# Altium footprint library 10A_Motor_Driver.PcbLib: 68 footprints (part 3 of 5)
Each footprint in its own frame and in the unit in brackets; x right, y up, seen from the top. Pads: shape width x height; smd on the part's side, far side on the other; paste and mask are expansions set on the pad; w line width, h text height; cw(c..) or ccw(c..) is an arc to the next point about the centre after c.
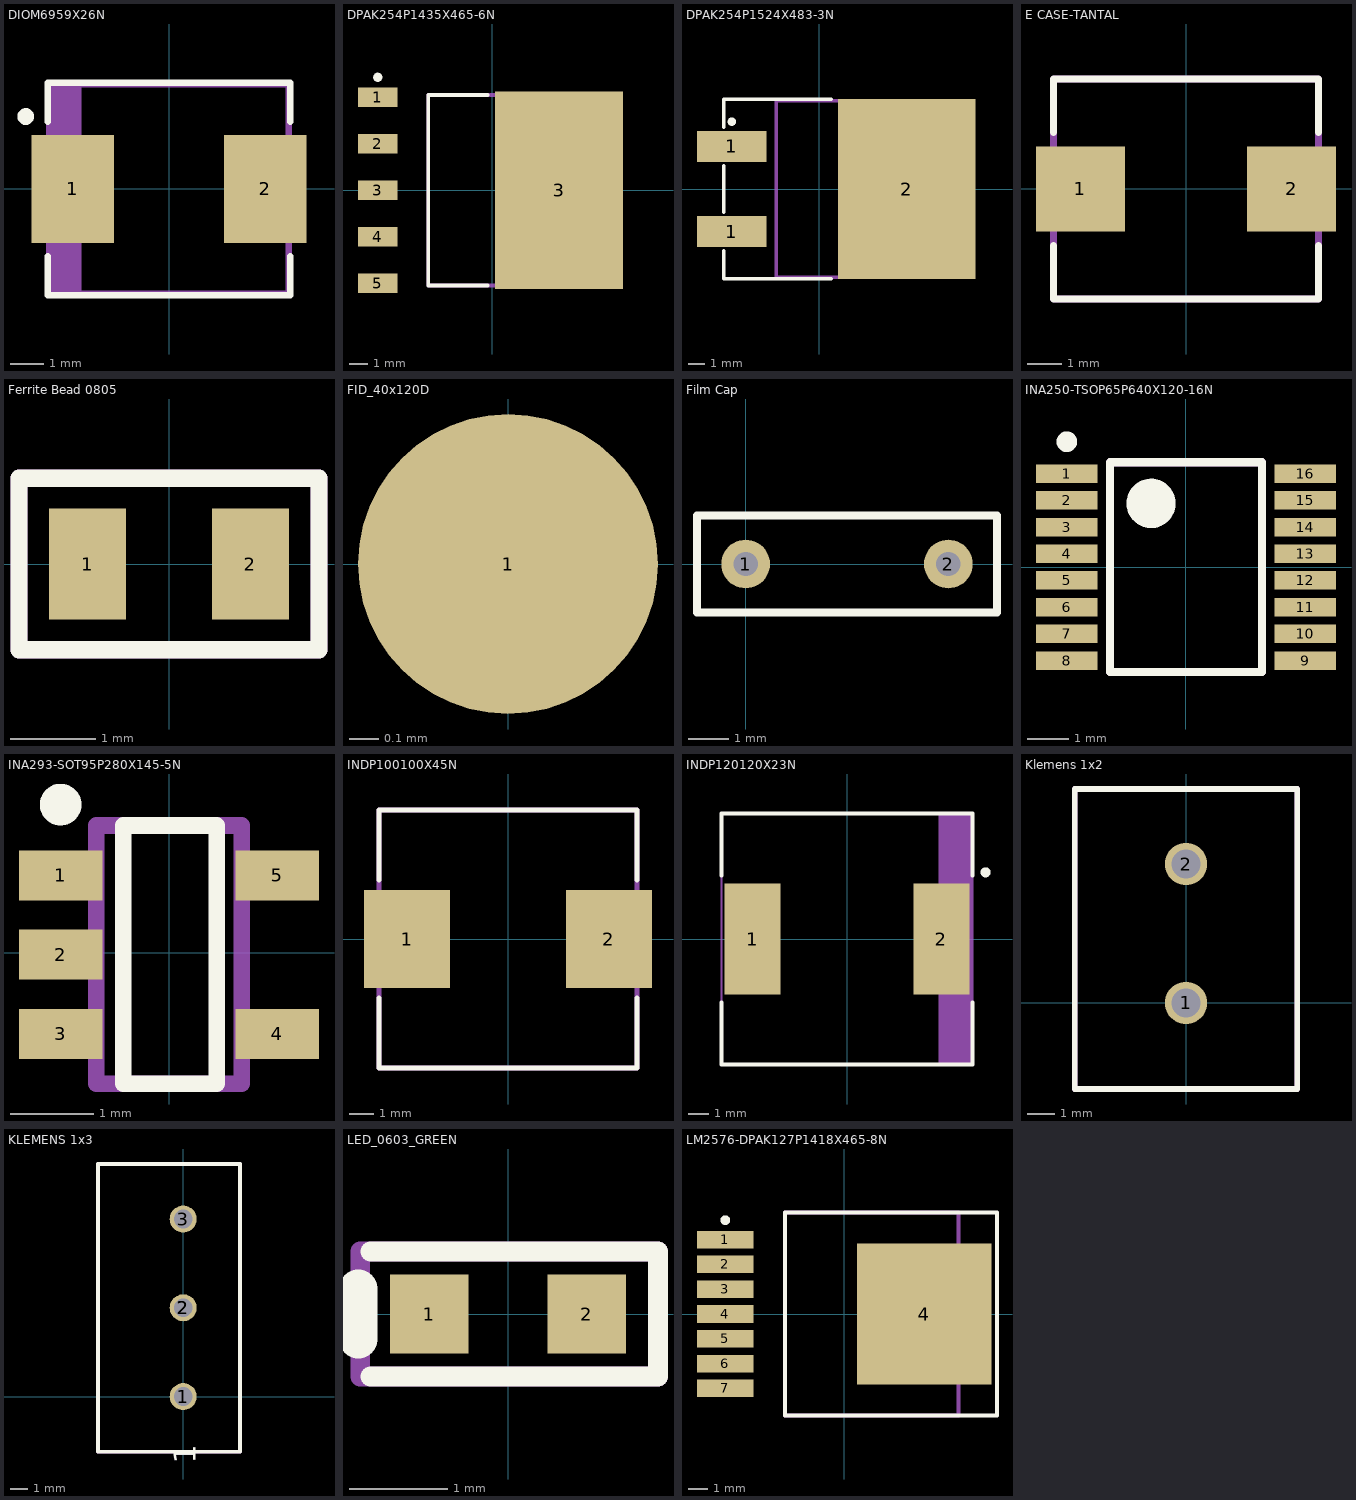
[diagram p2: the footprints below, top view; thin cyan lines are the x and y axes]

## DIOM6959X26N [mm] "Molded Diode, 2-Leads, Body 6,86x5,91mm, IPC Medium Density"
height 2.62
pads (2):
  rect 2.45x3.2 smd: 1(-2.85,0) 2(2.85,0)
Top Overlay:
  circle w0.25: c-4.25,2.15 r0.125
  lines w0.2: -3.6,-2 -3.6,-3.15 3.6,-3.15 3.6,-2 ; -3.6,2 -3.6,3.15 3.6,3.15 3.6,2
Top Assembly (Mech29):
  rectangle: -3.555,-3.11 -2.599,3.11
  lines w0.2: -3.555,-3.11 3.555,-3.11 3.555,3.11 -3.555,3.11 -3.555,-3.11
3D body "DIOM6959X26N.step": height 2.62, standoff 0, extent -3.775,-3.11 3.775,3.11

## DPAK254P1435X465-6N [mm] "D2-PAK, 6-Pads, Body 7,55x8,57mm (max), IPC Medium Density"
height 4.65
pads (6):
  rect 2.16x1.07 smd: 1(-6.25,5.08) 2(-6.25,2.54) 3(-6.25,0) 4(-6.25,-2.54) 5(-6.25,-5.08)
  rect 6.99x10.8 smd: 3(3.65,0)
Top Overlay:
  circle w0.25: c-6.25,6.165 r0.125
  lines w0.2: -0.245,-5.2 -3.5,-5.2 -3.5,5.2 -0.245,5.2
Top Assembly (Mech29):
  lines w0.2: -3.5,-5.2 5.39,-5.2 5.39,5.2 -3.5,5.2 -3.5,-5.2
3D body "DPAK254P1435X465-6N.step": height 4.8, standoff 0, extent -7.255,-5.5 7.095,5.5

## DPAK254P1524X483-3N [mm] "D2-PAK, 3-Pads, Body 7,93x8,70mm (max), IPC Medium Density"
height 4.83
pads (3):
  rect 4.15x1.85 smd: 1(-5.225,-2.54) 1(-5.225,2.54)
  rect 8.2x10.75 smd: 2(5.225,0)
Top Overlay:
  circle w0.25: c-5.225,4.015 r0.125
  lines w0.2: -5.706,-5.35 0.725,-5.35 ; -5.706,-5.334 -5.706,-3.683 ; -5.706,-1.397 -5.706,1.397 ; -5.706,3.683 -5.706,5.334 ; -5.706,5.35 0.725,5.35
Top Assembly (Mech29):
  lines w0.2: 7,-5.275 -2.575,-5.275 -2.575,5.275 7.025,5.275 7.025,-5.275
3D body "DPAK254P1524X483-3N.step": height 4.93, standoff 0, extent -5.545,-5.325 9.7,5.325

## E CASE-TANTAL [mm] "Molded Capacitor, 2-Leads, Body 7,30x6,00mm, IPC Medium Density"
height 4.6
pads (2):
  rect 2.55x2.45 smd: 1(-3.025,0) 2(3.025,0)
Top Overlay:
  lines w0.2: -3.8,-1.625 -3.8,-3.15 3.8,-3.15 3.8,-1.625 ; -3.8,1.625 -3.8,3.15 3.8,3.15 3.8,1.625
Top Assembly (Mech29):
  lines w0.2: -3.8,-3.15 -3.8,3.15 3.8,3.15 3.8,-3.15 -3.8,-3.15
3D body "E CASE-TANTAL.step": height 4.6, standoff 0, extent -4.02,-3.15 4.02,3.15

## Ferrite Bead 0805 [mm]
pads (2):
  rect 0.9x1.3 smd: 1(-0.95,0) 2(0.95,0)
Top Overlay:
  lines w0.2: -1.75,-1 1.75,-1 1.75,1 -1.75,1 -1.75,-1
Assembly Notes:
  lines w0.2: -1.75,-1 -1.75,1 1.75,1 1.75,-1 -1.75,-1
Top Assembly (Mech29):
  lines w0.2: -1.75,-1 -1.75,1 1.75,1 1.75,-1 -1.75,-1
  text ".Designator" at -1.3,-0.7 h0.6
3D body "User Library-ind_0805.step": height 0.95, standoff 0, extent -1,-0.6 1,0.6

## FID_40x120D [mil]
pads (1):
  round 40 smd paste-1574.8 mask+40: 1(0,0)

## Film Cap [mm]
pads (2):
  round 1.2 hole 0.6: 1(0,0) 2(5,0)
Top Overlay:
  lines w0.2: -1.2,-1.2 6.2,-1.2 6.2,1.2 -1.2,1.2 -1.2,-1.2
3D body "User Library-Cap-5 (7_2x6_5x2_2)Dark.step": height 8.53, standoff -2, extent -1.101,-1.1 6.103,1.1

## Heat Sink TO-220 [mm]
3D body "User Library-DISS_ML33.STEP": height 36.4, standoff -0.04, extent -17.548,3.411 20.298,23.401

## INA250-TSOP65P640X120-16N [mm] "TSOP, 16-Leads, Body 5,00x4,40mm, Pitch 0,65mm, IPC Medium Density"
height 1.2
pads (16):
  rect 1.5x0.45 smd mask+0.06: 1(-2.9,2.275) 2(-2.9,1.625) 3(-2.9,0.975) 4(-2.9,0.325) 5(-2.9,-0.325) 6(-2.9,-0.975) 7(-2.9,-1.625) 8(-2.9,-2.275) 9(2.9,-2.275) 10(2.9,-1.625) 11(2.9,-0.975) 12(2.9,-0.325) 13(2.9,0.325) 14(2.9,0.975) 15(2.9,1.625) 16(2.9,2.275)
Top Overlay:
  circle w0.6: c-0.85,1.55 r0.3
  circle w0.25: c-2.9,3.05 r0.125
  lines w0.2: -1.85,-2.55 1.85,-2.55 1.85,2.55 -1.85,2.55 -1.85,-2.55
Top Assembly (Mech29):
  circle w0.254: c-0.825,1.575 r0.25
  lines w0.2: -1.85,-2.55 1.85,-2.55 1.85,2.55 -1.85,2.55 -1.85,-2.55
  text ".Designator" at 0.833,-1.2 h0.8
3D body "TSOP65P640X120-16N.step": height 1.2, standoff 0, extent -3.2,-2.55 3.2,2.55

## INA293-SOT95P280X145-5N [mm] "SOT23, 5-Leads, Body 2,90x2,80mm, Pitch 0,95mm, IPC Medium Density"
height 1.45
pads (5):
  rect 1x0.6 smd: 1(-1.3,0.925) 2(-1.3,-0.025) 3(-1.3,-0.975) 4(1.3,-0.975) 5(1.3,0.925)
Top Overlay:
  circle w0.25: c-1.3,1.775 r0.125
  lines w0.2: -0.55,-1.575 -0.55,1.525 0.575,1.525 0.575,-1.575 -0.55,-1.575
Top Assembly (Mech29):
  lines w0.2: -0.875,-1.575 0.875,-1.575 0.875,1.525 -0.875,1.525 -0.875,-1.575
3D body "SOT95P280X145-5N.step": height 1.45, standoff 0, extent -1.5,-1.55 1.5,1.5

## INDP100100X45N [mm] "Precision Wire Wound Inductor, 2-Leads, Body 10,00x10,00mm, IPC Medium Density"
height 4.5
pads (2):
  rect 3.5x4 smd: 1(-4.1,0) 2(4.1,0)
Top Overlay:
  lines w0.2: -5.25,-2.4 -5.25,-5.25 5.25,-5.25 5.25,-2.4 ; -5.25,2.4 -5.25,5.25 5.25,5.25 5.25,2.4
Top Assembly (Mech29):
  lines w0.2: -5.25,-5.25 -5.25,5.25 5.25,5.25 5.25,-5.25 -5.25,-5.25
3D body "INDP100100X45N.step": height 4.6, standoff 0, extent -5.1,-5 5.1,5

## INDP120120X23N [mm] "Precision Wire Wound Inductor, 2-Leads, Body 12,00x12,00mm, IPC Medium Density"
height 2.29
pads (2):
  rect 2.8x5.54 smd: 1(-4.7,0) 2(4.7,0)
Top Overlay:
  circle w0.25: c6.9,3.32 r0.125
  lines w0.2: -6.25,-3.17 -6.25,-6.25 6.25,-6.25 6.25,-3.17 ; -6.25,3.17 -6.25,6.25 6.25,6.25 6.25,3.17
Top Assembly (Mech29):
  rectangle: 4.569,-6.25 6.25,6.25
  lines w0.1: -6.25,-6.25 -6.25,6.25 6.25,6.25 6.25,-6.25 -6.25,-6.25
3D body "INDP120120X23N.step": height 2.39, standoff 0, extent -6.1,-6 6.1,6

## Klemens 1x2 [mil]
pads (2):
  round 60 hole 41.34: 1(0,0) 2(0,196.85)
Top Overlay:
  lines w7.87: -157.48,-122.05 133.86,-122.05 141.73,-122.05 157.48,-122.05 157.48,303.15 -157.48,303.15 -157.48,-122.05
Top Assembly (Mech29):
  lines w7.87: -157.48,-122.05 157.48,-122.05 157.48,303.15 -157.48,303.15 -157.48,-122.05
  text ".Designator" at 113.65,-74.8 h48.82
3D body "User Library-CN_BT_1X2.step": height 394.2, standoff -89.42, extent -151.57,-118.1 151.57,295.28

## KLEMENS 1x3 [mil]
pads (4):
  round 60 hole 41.34: 1(0,0) 2(0,196.85) 2(0,196.85) 3(0,393.7)
Top Overlay:
  lines w7.87: -188.98,-122.05 -188.98,515.75 125.98,515.75 125.98,-122.05 -188.98,-122.05
  text "1" at 27.56,-149.6 h48.82
Top Assembly (Mech29):
  lines w7.87: -188.98,-122.05 -188.98,515.75 125.98,515.75 125.98,-122.05 -188.98,-122.05
  text ".Designator" at 82.16,-11.81 h48.82
3D body "User Library-Terminal-Screw-3A-3way.step": height 393.7, standoff -118.11, extent -181.1,-122.05 118.11,492.13

## LED_0603_GREEN [mm]
pads (2):
  rect 0.8x0.8 smd: 1(-0.8,0) 2(0.8,0)
Top Overlay:
  lines w0.2: -1.397,-0.635 1.524,-0.635 1.524,0.635 1.397,0.635 -1.397,0.635
  lines w0.4: -1.524,-0.254 -1.524,0.254
Top Assembly (Mech29):
  lines w0.2: -1.5,-0.635 -1.5,0.635 1.524,0.635 1.524,-0.635 -1.5,-0.635
  text ".Designator" at -0.052,-0.03 h0.6
3D body "User Library-LED SMD 0603 super red.step": height 0.65, standoff 0, extent -0.85,-0.4 0.85,0.4
3D body: height 0.66, standoff 0.55, extent -0.15,-0.15 0.15,0.15

## LM2576-DPAK127P1418X465-8N [mm] "D2-PAK, 8-Pads, Body 7,55x8,57mm (max), IPC Medium Density"
height 4.65
pads (8):
  rect 2.9x0.9 smd: 1(-6.1,3.81) 2(-6.1,2.54) 3(-6.1,1.27) 4(-6.1,0) 5(-6.1,-1.27) 6(-6.1,-2.54) 7(-6.1,-3.81)
  rect 6.9x7.2 smd: 4(4.1,0)
Top Overlay:
  circle w0.25: c-6.1,4.81 r0.125
  lines w0.2: -3.05,-5.2 -3.05,5.2 7.823,5.2 7.823,-5.2 -3.05,-5.2
Top Assembly (Mech29):
  lines w0.2: -3.05,-5.2 -3.05,5.2 5.84,5.2 5.84,-5.2 -3.05,-5.2
3D body "LM2576-DPAK127P1418X465-8N.step": height 4.8, standoff 0, extent -6.8,-5.2 7.375,5.2